# Altium footprint library Amirreza.PcbLib: 524 footprints (part 4 of 33)
Each footprint in its own frame and in the unit in brackets; x right, y up, seen from the top. Pads: shape width x height; smd on the part's side, far side on the other; paste and mask are expansions set on the pad; w line width, h text height; cw(c..) or ccw(c..) is an arc to the next point about the centre after c.
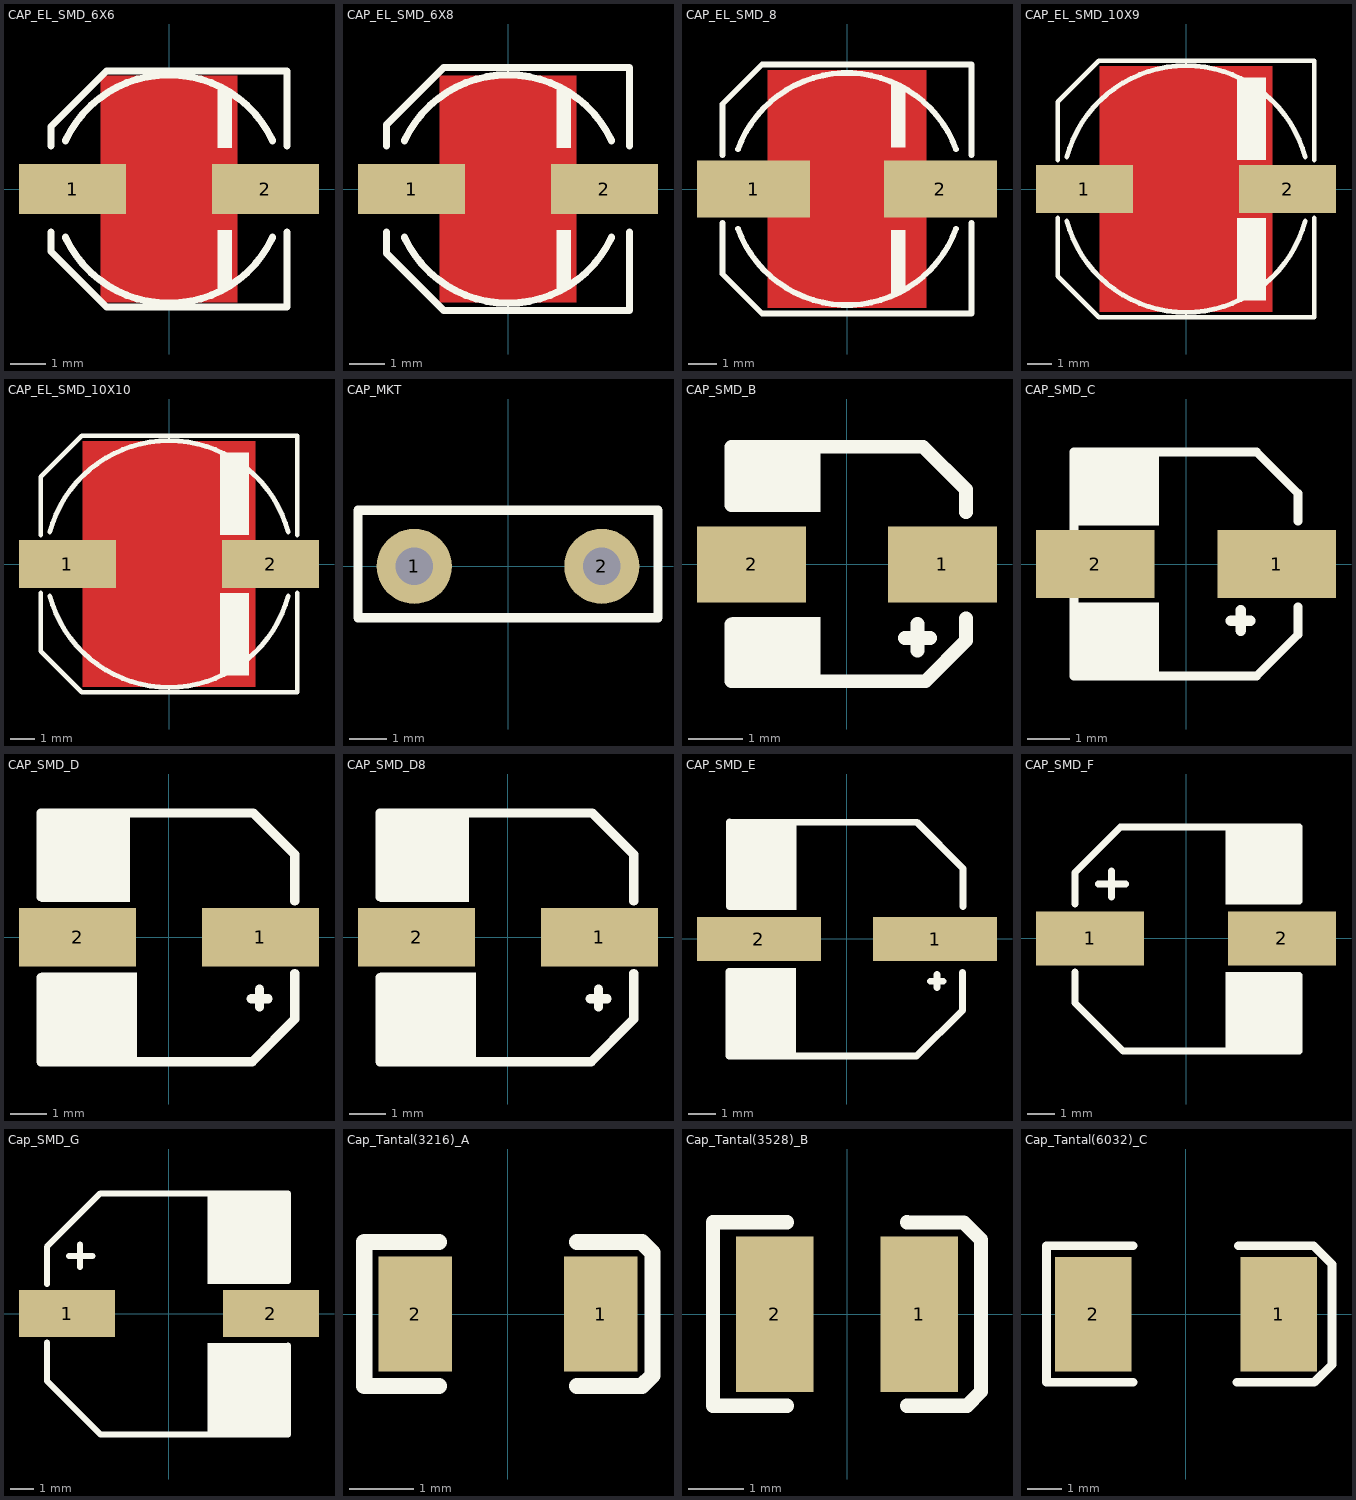
[diagram p3: the footprints below, top view; thin cyan lines are the x and y axes]

## CAP_EL_SMD_6X6 [mm] "Electrolytic Cap, D: 6.3mm L: 5.8mm, Size D"
height 5.8
pads (2):
  rect 3x1.4 smd: 1(-2.7,0) 2(2.7,0)
Top Layer:
  pour cut-out: 1.905,3.175 1.905,-3.175 -1.905,-3.175 -1.905,3.175
Top Overlay:
  rectangle: 1.36,1.143 1.76,2.8
  rectangle: 1.36,-2.8 1.76,-1.143
  lines w0.2: -3.3,-1.2 -3.3,-1.75 -1.75,-3.3 3.3,-3.3 3.3,-1.2 ; -3.3,1.2 -3.3,1.75 -1.75,3.3 3.3,3.3 3.3,1.2 ; -2.9,-1.352 ccw(c0,0) 2.9,-1.352 ; -2.9,1.352 cw(c0,0) 2.9,1.352
3D body "6.3x5.8x2.2.stp": height 5.8, standoff 0, extent -3.65,-3.3 3.65,3.3

## CAP_EL_SMD_6X8 [mm] "Electrolytic Cap, D: 6.3mm L: 7.7mm, Size D"
height 7.7
pads (2):
  rect 3x1.4 smd: 1(-2.7,0) 2(2.7,0)
Top Layer:
  pour cut-out: 1.905,3.175 1.905,-3.175 -1.905,-3.175 -1.905,3.175
Top Overlay:
  rectangle: 1.36,-2.8 1.76,-1.143
  rectangle: 1.36,1.143 1.76,2.8
  lines w0.2: -3.4,-1.2 -3.4,-1.8 -1.8,-3.4 3.4,-3.4 3.4,-1.2 ; -3.4,1.2 -3.4,1.8 -1.8,3.4 3.4,3.4 3.4,1.2 ; -2.9,-1.352 ccw(c0,0) 2.9,-1.352 ; -2.9,1.352 cw(c0,0) 2.9,1.352
3D body "6.3x7.7x2.2.stp": height 7.7, standoff 0, extent -3.65,-3.3 3.65,3.3

## CAP_EL_SMD_8 [mm] "Electrolytic Cap, Size E, Size F, 8.3X10"
height 10
pads (2):
  rect 4x2 smd: 1(-3.3,0) 2(3.3,0)
Top Layer:
  pour cut-out: 2.794,4.191 2.794,-4.191 -2.794,-4.191 -2.794,4.191
Top Overlay:
  rectangle: 1.56,-3.679 2.06,-1.448
  rectangle: 1.56,1.473 2.06,3.682
  lines w0.2: -4.4,-1.2 -4.4,-3 -3,-4.4 4.4,-4.4 4.4,-1.2 ; -4.4,1.2 -4.4,3 -3,4.4 4.4,4.4 4.4,1.2 ; -3.853,-1.402 ccw(c0,0) 3.853,-1.402 ; -3.853,1.402 cw(c0,0) 3.853,1.402
3D body "Cap_0810.STEP": height 10.3, standoff -0.2, extent -4.902,-4.25 4.798,4.25

## CAP_EL_SMD_10X9 [mm] "Electrolytic Cap, 10.3mm, L: 8.7mm"
height 8.7
pads (2):
  rect 4x2 smd: 1(-4.2,0) 2(4.2,0)
Top Layer:
  pour cut-out: -3.556,5.08 -3.556,-5.08 3.556,-5.08 3.556,5.08
Top Overlay:
  rectangle: 2.1,1.2 3.3,4.6
  rectangle: 2.1,-4.6 3.3,-1.2
  lines w0.2: -5.3,-1.2 -5.3,-3.6 -3.6,-5.3 5.3,-5.3 5.3,-1.2 ; -5.3,1.2 -5.3,3.6 -3.6,5.3 5.3,5.3 5.3,1.2 ; -4.926,-1.32 ccw(c0,0) 4.926,-1.32 ; -4.926,1.32 cw(c0,0) 4.926,1.32
3D body "10x8.7x4.5.stp": height -0.4, standoff -9.1, extent -5.5,-5.15 5.5,5.15

## CAP_EL_SMD_10X10 [mm] "Electrolytic Cap, 10.3mm, L: 10mm"
height 10
pads (2):
  rect 4x2 smd: 1(-4.2,0) 2(4.2,0)
Top Layer:
  pour cut-out: -3.556,5.08 -3.556,-5.08 3.556,-5.08 3.556,5.08
Top Overlay:
  rectangle: 2.1,1.2 3.3,4.6
  rectangle: 2.1,-4.6 3.3,-1.2
  lines w0.2: -5.3,-1.2 -5.3,-3.6 -3.6,-5.3 5.3,-5.3 5.3,-1.2 ; -5.3,1.2 -5.3,3.6 -3.6,5.3 5.3,5.3 5.3,1.2 ; -4.926,-1.32 ccw(c0,0) 4.926,-1.32 ; -4.926,1.32 cw(c0,0) 4.926,1.32
3D body "User Library-cap_10x10x10-1.STEP": height 10.5, standoff 0, extent -5.901,-5.25 5.899,5.25

## CAP_MKT [mil]
pads (2):
  round 80 hole 40: 1(-100,0) 2(100,0)
Top Overlay:
  lines w10: -160,-55 160,-55 160,60 -160,60 -160,-55
3D body "User Library-Film Capacitor 7_2x2_5x6_5mm.step": height 256.3, standoff -98.03, extent -140.73,-48.43 142.73,50

## CAP_SMD_B [mm]
pads (2):
  rect 2x1.4 smd: 1(1.75,0) 2(-1.75,0)
Top Overlay:
  region: -0.485,-0.965 -2.118,-0.965 -2.118,-2.141 -0.485,-2.141
  region: -0.485,2.159 -2.118,2.159 -2.118,0.965 -0.485,0.965
  lines w0.254: -2.118,-1.1 -2.118,-2.141 1.438,-2.141 2.182,-1.397 2.182,-0.991 ; -2.118,1.092 -2.118,2.159 1.394,2.159 2.182,1.372 2.182,0.965 ; 1.064,-1.346 1.521,-1.346 ; 1.293,-1.575 1.293,-1.092
3D body "User Library-capacitor size B.step": height 5.46, standoff 0.04, extent -2.3,-2.15 2.3,2.15

## CAP_SMD_C [mm]
pads (2):
  rect 2.8x1.6 smd: 1(2.15,0) 2(-2.15,0)
Top Overlay:
  region: -0.633,-0.914 -2.65,-0.914 -2.65,-2.65 -0.633,-2.65
  region: -0.633,2.65 -2.65,2.65 -2.65,0.914 -0.633,0.914
  lines w0.203: 2.65,-1.007 2.65,-1.668 1.668,-2.65 -2.65,-2.65 -2.65,2.65 1.668,2.65 2.65,1.668 2.65,1.007
  lines w0.254: 1.064,-1.346 1.521,-1.346 ; 1.293,-1.575 1.293,-1.092
3D body "User Library-capacitor size C.step": height 5.41, standoff -0.01, extent -2.95,-2.65 2.95,2.65

## CAP_SMD_D [mm]
pads (2):
  rect 3.2x1.6 smd: 1(2.5,0) 2(-2.5,0)
Top Overlay:
  region: -0.878,-3.4 -0.878,-0.965 -3.5,-0.965 -3.5,-3.4
  region: -1.06,3.4 -3.494,3.4 -3.494,0.965 -1.06,0.965
  lines w0.254: -3.5,-1.1 -3.5,-3.4 2.275,-3.4 3.44,-2.235 3.44,-0.991 ; -3.5,3.4 2.3,3.4 3.44,2.261 3.44,0.991 ; -3.494,1.1 -3.494,3.4 ; 2.246,-1.676 2.703,-1.676 ; 2.475,-1.905 2.475,-1.422
3D body "User Library-capacitor size D.step": height 5.46, standoff 0.04, extent -3.5,-3.3 3.5,3.3

## CAP_SMD_D8 [mm]
pads (2):
  rect 3.2x1.6 smd: 1(2.5,0) 2(-2.5,0)
Top Overlay:
  region: -0.878,-3.4 -0.878,-0.965 -3.5,-0.965 -3.5,-3.4
  region: -1.06,3.4 -3.494,3.4 -3.494,0.965 -1.06,0.965
  lines w0.254: -3.5,-1.1 -3.5,-3.4 2.275,-3.4 3.44,-2.235 3.44,-0.991 ; -3.5,3.4 2.3,3.4 3.44,2.261 3.44,0.991 ; -3.494,1.1 -3.494,3.4 ; 2.246,-1.676 2.703,-1.676 ; 2.475,-1.905 2.475,-1.422
3D body "User Library-capacitor size D8.step": height 7.71, standoff -0.01, extent -3.5,-3.3 3.5,3.3

## CAP_SMD_E [mm]
pads (2):
  rect 4.5x1.6 smd: 1(3.2,0) 2(-3.2,0)
Top Overlay:
  region: -1.842,4.25 -4.277,4.25 -4.277,1.06 -1.842,1.06
  region: -1.848,-1.06 -4.283,-1.06 -4.283,-4.25 -1.848,-4.25
  lines w0.254: -4.283,-1.188 -4.283,-4.25 2.532,-4.25 4.191,-2.591 4.191,-1.213 ; -4.277,1.187 -4.277,4.25 2.541,4.241 4.217,2.565 4.217,1.187 ; 3.038,-1.535 3.495,-1.535 ; 3.267,-1.764 3.267,-1.281
3D body "User Library-capacitor size E.step": height 6.25, standoff 0.04, extent -4.5,-4.15 4.5,4.15

## CAP_SMD_F [mm]
pads (2):
  rect 4x2 smd: 1(-3.55,0) 2(3.55,0)
Top Overlay:
  rectangle: 1.454,-4.166 4.191,-1.245
  rectangle: 1.454,1.245 4.191,4.115
  lines w0.254: -4.109,-1.245 -4.109,-2.388 -2.331,-4.166 4.191,-4.166 4.191,-1.372 ; -4.109,1.27 -4.109,2.438 -2.432,4.115 4.191,4.115 4.191,1.372 ; -3.245,2.007 -2.229,2.007 ; -2.763,1.524 -2.763,2.489
3D body "User Library-A3D-003-00014.step": height 10.25, standoff 0.05, extent -4.85,-4.15 4.85,4.15

## Cap_SMD_G [mm]
pads (2):
  rect 4.1x2 smd: 1(-4.35,0) 2(4.35,0)
Top Overlay:
  rectangle: 1.647,-5.166 5.089,-1.254
  rectangle: 1.647,1.26 5.089,5.121
  lines w0.254: -5.214,-1.245 -5.214,-2.87 -2.915,-5.169 5.086,-5.169 ; -5.214,1.27 -5.214,2.845 -2.928,5.131 5.086,5.131 5.086,1.397 ; -4.274,2.464 -3.258,2.464 ; -3.791,1.981 -3.791,2.946 ; 5.086,-5.156 5.086,-1.372
3D body "User Library-A3D-003-00015.step": height 9.35, standoff -0.85, extent -5.85,-5.15 5.85,5.15

## Cap_Tantal(3216)_A [mm]
pads (2):
  rect 1.15x1.8 smd: 1(1.45,0) 2(-1.45,0)
Top Overlay:
  lines w0.254: -1.079,-1.128 -2.251,-1.128 -2.251,1.128 -1.079,1.128 ; 1.079,-1.126 2.1,-1.126 2.262,-0.964 2.262,0.964 2.1,1.126 ; 1.079,1.13 2.095,1.126
3D body "User Library-AVX_ACASE.step": height 1.71, standoff 0, extent -1.7,-0.84 1.7,0.84

## Cap_Tantal(3528)_B [mm]
pads (2):
  rect 1.4x2.8 smd: 1(1.3,0) 2(-1.3,0)
Top Overlay:
  lines w0.254: -1.079,-1.651 -2.413,-1.651 -2.413,1.653 -2.251,1.653 -1.079,1.653 ; 1.079,-1.651 2.159,-1.651 2.413,-1.397 2.413,1.338 2.101,1.65 1.079,1.653
3D body "User Library-AVX_BCASE.step": height 2.03, standoff 0, extent -1.85,-1.465 1.85,1.465

## Cap_Tantal(6032)_C [mm]
pads (2):
  rect 2.2x3.3 smd: 1(2.675,0) 2(-2.675,0)
Top Overlay:
  lines w0.254: -1.532,-1.956 -4.021,-1.956 -4.021,0.076 -4.021,1.981 -1.532,1.981 ; 1.465,-1.956 3.7,-1.956 4.208,-1.448 4.208,1.448 3.675,1.981 1.516,1.981
3D body "User Library-CAP_TANT_6032-28_y.step": height 2.8, standoff 0, extent -3.15,-1.75 3.15,1.75